# Altium footprint library Cty1.PcbLib: 1378 footprints (part 44 of 87)
Each footprint in its own frame and in the unit in brackets; x right, y up, seen from the top. Pads: shape width x height; smd on the part's side, far side on the other; paste and mask are expansions set on the pad; w line width, h text height; cw(c..) or ccw(c..) is an arc to the next point about the centre after c.
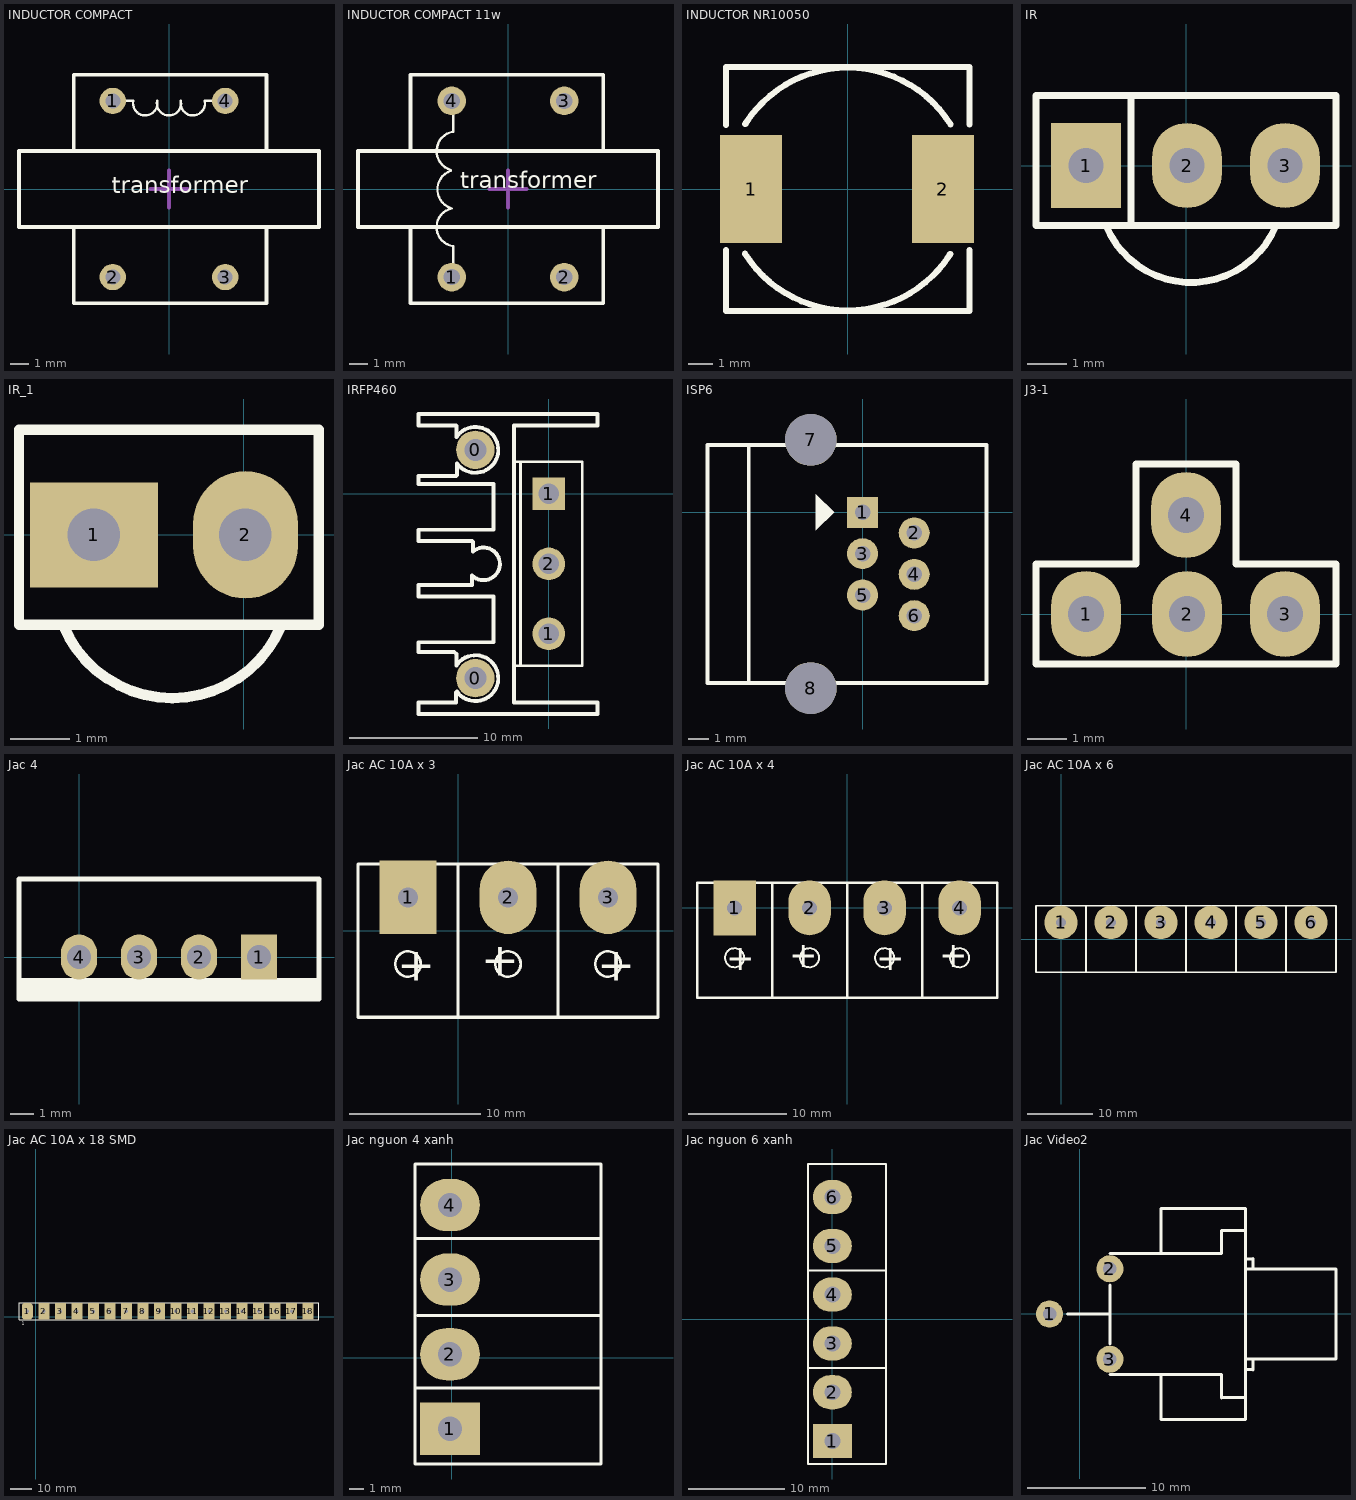
[diagram p43: the footprints below, top view; thin cyan lines are the x and y axes]

## INDUCTOR COMPACT [mm]
pads (4):
  round 1.4 hole 0.8 unplated mask+0.01: 1(-3,4.7) 2(-3,-4.7) 3(3,-4.7) 4(3,4.7)
Top Overlay:
  lines w0.127: -3.048,4.699 -1.905,4.699 ccw(c-1.27,4.572) -0.629,4.664 ; -0.635,4.699 ccw(c0,4.572) 0.641,4.664 ; 0.635,4.699 ccw(c1.27,4.572) 1.911,4.664 ; 1.905,4.699 2.794,4.699
  lines w0.2: -5.08,-2.032 -5.08,-6.096 5.207,-6.096 5.207,-2.032 ; -5.08,2.032 -5.08,6.096 5.207,6.096 5.207,2.032 ; -8.001,-2.032 -8.001,2.032 8.001,2.032 8.001,-2.032 -8.001,-2.032
  text "transformer" at -3.048,-0.508 h1.52
Mechanical 15:
  lines w0.2: -1,0 1,0 ; 0,-1 0,1
3D body "cuon cam.STEP": height 15.5, standoff -2.45, extent -8,-5.968 8,6.032

## INDUCTOR COMPACT 11w [mil]
pads (4):
  round 60 hole 34: 1(-118.11,-185.04) 4(-118.11,185.04)
  round 60 hole 34 unplated: 2(118.11,-185.04) 3(118.11,185.04)
Top Overlay:
  lines w5: -120,-40 cw(c-106.96,-0.88) -120,38.23 ; -120,40 cw(c-108.67,79.64) -115.06,120.38 ; -118.04,-40.88 ccw(c-109.86,-80.19) -115,-120 -115,-185 ; -115,120 -115,175
  lines w7.87: -205,-85 -205,-240 200,-240 200,-80 ; -205,80 -205,240 200,240 200,80 ; -315,-80 -315,80 315,80 315,-80 -315,-80
  text "transformer" at -100,-10 h60
Mechanical 15:
  lines w7.87: -39.37,0 39.37,0 ; 0,-39.37 0,39.37
3D body "cuon cam.STEP": height 610.24, standoff -96.46, extent -314.96,-235 314.96,237.44

## INDUCTOR NR10050 [mm] "NR10050T100M"
height 5
pads (2):
  rect 2.6x4.5 smd: 1(-4.032,0) 2(3.968,0)
Top Overlay:
  lines w0.254: -5.08,-2.54 -5.08,-5.08 5.08,-5.08 5.08,-2.54 ; -5.08,2.667 -5.08,5.08 -4.445,5.08 5.08,5.08 5.08,2.698 ; -4.279,-2.698 ccw(c0,0) 4.271,-2.711 ; -4.271,2.711 cw(c0,0) 4.279,2.698
3D body "SUMIDA-CDHR10D68R_T125 10x10mm.step": height 6.95, standoff 0.05, extent -5.197,-5.014 5.103,4.986

## IR [mil] "Receiver Infared IC"
height 200
pads (3):
  rect 70x85 hole 35: 1(-100,0)
  oval 70x85 hole 35: 2(1,0) 3(99,0)
Top Overlay:
  lines w7: -80,-60 ccw(c5,-25) 90,-60 ; -55,-60 -55,70 ; -150,-60 150,-60 150,70 -150,70 -150,-60

## IR_1 [mil] "Receiver Infared IC"
height 200
pads (2):
  rect 85x70 hole 35: 1(-100,0)
  oval 70x85 hole 35: 2(1,0)
Top Overlay:
  lines w7: -120.62,-60 ccw(c-47.81,-30.02) 25,-60 ; -150,-60 -150,70 50,70 50,-60 -150,-60
3D body "User Library-QSE113.STEP": height 493.7, standoff -206.3, extent -134.8,-91.32 40,31.32

## IRFP460 [mm]
pads (5):
  round 3 hole 1.7: 0(-5.715,-14.351) 0(-5.715,3.429)
  round 2.54 hole 1.6: 1(0,-10.9) 2(0,-5.45)
  rect 2.54x2.54 hole 1.6: 1(0,0)
Top Overlay:
  lines w0.2: -2.2,-13.4 -2.2,2.5 ; -2.7,-13.4 2.6,-13.4 2.6,2.5 -2.7,2.5 -2.7,-13.4
  lines w0.305: -2.7,2.159 -2.7,5.334 3.81,5.334 3.81,6.223 -10.16,6.223 -10.16,5.334 -7.239,5.334 -7.198,5.293 -7.198,4.418 cw(c-5.715,3.429) -7.157,2.381 -7.157,1.479 -7.239,1.397 -8.382,1.397 -10.16,1.397 -10.16,0.762 -4.318,0.762 -4.318,-2.794 -10.16,-2.794 -10.16,-3.683 -5.969,-3.683 -5.9,-3.752 -5.9,-4.48 cw(c-5.08,-5.45) -5.972,-6.354 -5.972,-7.109 -5.969,-7.112 -10.16,-7.112 -10.16,-8.001 -4.318,-8.001 -4.318,-11.557 -10.16,-11.557 -10.16,-12.319 -7.366,-12.319 -7.198,-12.487 -7.198,-13.362 cw(c-5.715,-14.351) -7.157,-15.399 -7.239,-15.482 -7.239,-16.256 -10.16,-16.256 -10.16,-17.145 3.81,-17.145 3.81,-16.256 -2.7,-16.256 -2.7,3.048

## ISP6 [mil] "Jac nap PIC"
pads (8):
  rect 60x60 hole 30: 1(0,0)
  round 60 hole 30: 2(100,-40) 3(0,-80) 4(100,-120) 5(0,-160) 6(100,-200)
  round 100 hole 100: 7(-100,140) 8(-100,-340)
Top Overlay:
  region: -55,0 -90,35 -90,-35
  lines w7: -220,-330 -220,130
  lines w8: -300,-330 240,-330 240,130 -300,130 -300,-330

## J3-1 [mil] "Jumper 4"
height 200
pads (4):
  oval 70x86 hole 36: 1(-100,0) 2(1,0) 3(99,0) 4(0,99)
Top Overlay:
  lines w7: -150,-50 150,-50 150,50 50,50 50,150 -50,150 -50,50 -150,50 -150,-50

## Jac 4 [mil] "Jac connect 4pin"
pads (4):
  rect 60x75 hole 40: 1(300,0)
  oval 60x75 hole 40: 2(200,0) 3(100,0) 4(0,0)
Top Overlay:
  rectangle: -100,-70 400,-35
  lines w7.87: -100,-70 -100,130 400,130 400,-70 -100,-70

## Jac AC 10A x 3 [mil] "Jac nguon 220V 10A"
pads (3):
  rect 170x220 hole 60: 1(-150,100)
  oval 170x220 hole 60: 2(150,100) 3(450,100)
Top Overlay:
  circle w8: c450,-100 r38.08
  circle w8: c150,-100 r38.08
  circle w8: c-150,-100 r38.08
  lines w10: 0,-260 0,200 ; 300,-260 600,-260 600,200 300,200 ; 300,-260 300,200 ; 300,-260 -300,-260 -300,200 300,200 ; 300,-260 300,-200 ; 300,-200 300,200 ; 300,-200 300,200
  text "+" at 417,-150 h100
  text "+" at 183,-50 h100
  text "+" at -183,-150 h100

## Jac AC 10A x 4 [mil] "Jac nguon 220V 10A"
pads (4):
  rect 170x220 hole 60: 1(-450,0)
  oval 170x220 hole 60: 2(-150,0) 3(150,0) 4(450,0)
Top Overlay:
  circle w8: c450,-200 r38.08
  circle w8: c150,-200 r38.08
  circle w8: c-150,-200 r38.08
  circle w8: c-450,-200 r38.08
  lines w10: -300,-360 -300,100 ; 300,-360 300,100 ; 0,-360 600,-360 600,-300 ; 0,-360 0,100 ; 0,-360 -600,-360 -600,100 0,100 ; 0,-360 0,-300 ; 0,-300 0,100 ; 0,-300 0,100 ; 0,100 600,100 ; 600,-300 600,100 ; 600,-300 600,100
  text "+" at 483,-150 h100
  text "+" at 117,-250 h100
  text "+" at -117,-150 h100
  text "+" at -483,-250 h100

## Jac AC 10A x 6 [mil] "Jac nguon 220V 10A"
pads (6):
  round 200 hole 60: 1(0,100) 2(300,100) 3(600,100) 4(900,100) 5(1200,100) 6(1500,100)
Top Overlay:
  lines w10: 150,-200 150,200 ; 750,-200 750,200 ; 1350,-200 1350,200 ; 450,-200 -150,-200 -150,200 450,200 ; 450,-200 450,200 ; 450,-200 450,200 ; 450,-200 1050,-200 ; 450,200 1050,200 ; 1050,-200 1050,200 ; 1050,-200 1650,-200 1650,200 1050,200 ; 1050,-200 1050,200 ; 1050,-200 1050,200

## Jac AC 10A x 18 SMD [mil] "Jac nguon 220V 10A"
pads (18):
  rrect50% 200x300 hole 60: 1(-150,100)
  rect 200x300 hole 60: 2(150,100) 3(450,100) 4(750,100) 5(1050,100) 6(1350,100) 7(1650,100) 8(1950,100) 9(2250,100) 10(2550,100) 11(2850,100) 12(3150,100) 13(3450,100) 14(3750,100) 15(4050,100) 16(4350,100) 17(4650,100) 18(4950,100)
Top Overlay:
  lines w10: -300,-50 5150,-50 5150,250 -300,250 -300,-50
  text "1" at -250,-150 h60

## Jac nguon 4 xanh [mil] "Cau dau nguon xanh"
pads (4):
  rect 160x140 hole 65: 1(-5,-190)
  oval 160x140 hole 65: 2(-5,10) 3(-5,210) 4(-5,410)
Top Overlay:
  lines w8: -98.66,520 -98.66,-284.25 400,-284.25 400,519.75 -97.66,519.75 ; -97.66,-80.25 400,-80.25 ; -97.66,319.75 395,319.75 ; -91.66,113.75 400,113.75

## Jac nguon 6 xanh [mil] "Cau dau nguon xanh"
pads (6):
  rect 160x140 hole 65: 1(0,-500)
  oval 160x140 hole 65: 2(0,-300) 3(0,-100) 4(0,100) 5(0,300) 6(0,500)
Top Overlay:
  lines w8: -100,-200.25 215,-200.25 ; -100,200 215,199.75 ; -100,-594.25 220,-594.25 220,635.75 -100,635.75 -100,-594.25

## Jac Video2 [mil] "Jac Video Stereo"
pads (3):
  round 90 hole 45: 1(-100,0) 2(100,150) 3(100,-150)
Top Overlay:
  lines w10: -40,0 101,0 ; 100,-200 470,-200 ; 100,200 470,200 470,277 550,277 ; 101,-99 101,96 ; 270,200 270,350 550,350 ; 470,-277 548,-277 549,-276 ; 550,-277 550,-350 270,-350 ; 550,-150 850,-150 850,150 550,150 ; 551,-184 574,-184 575,-185 575,-151 ; 551,183 574,183 575,184 575,150 ; 270,-350 270,-200 270,-350 ; 470,-200 470,-278 470,-200 ; 550,277 550,350 ; 550,277 550,350 ; 550,-275 550,275 550,-275